# Altium footprint library lib_datalogger.PcbLib: 866 footprints (part 17 of 55)
Each footprint in its own frame and in the unit in brackets; x right, y up, seen from the top. Pads: shape width x height; smd on the part's side, far side on the other; paste and mask are expansions set on the pad; w line width, h text height; cw(c..) or ccw(c..) is an arc to the next point about the centre after c.
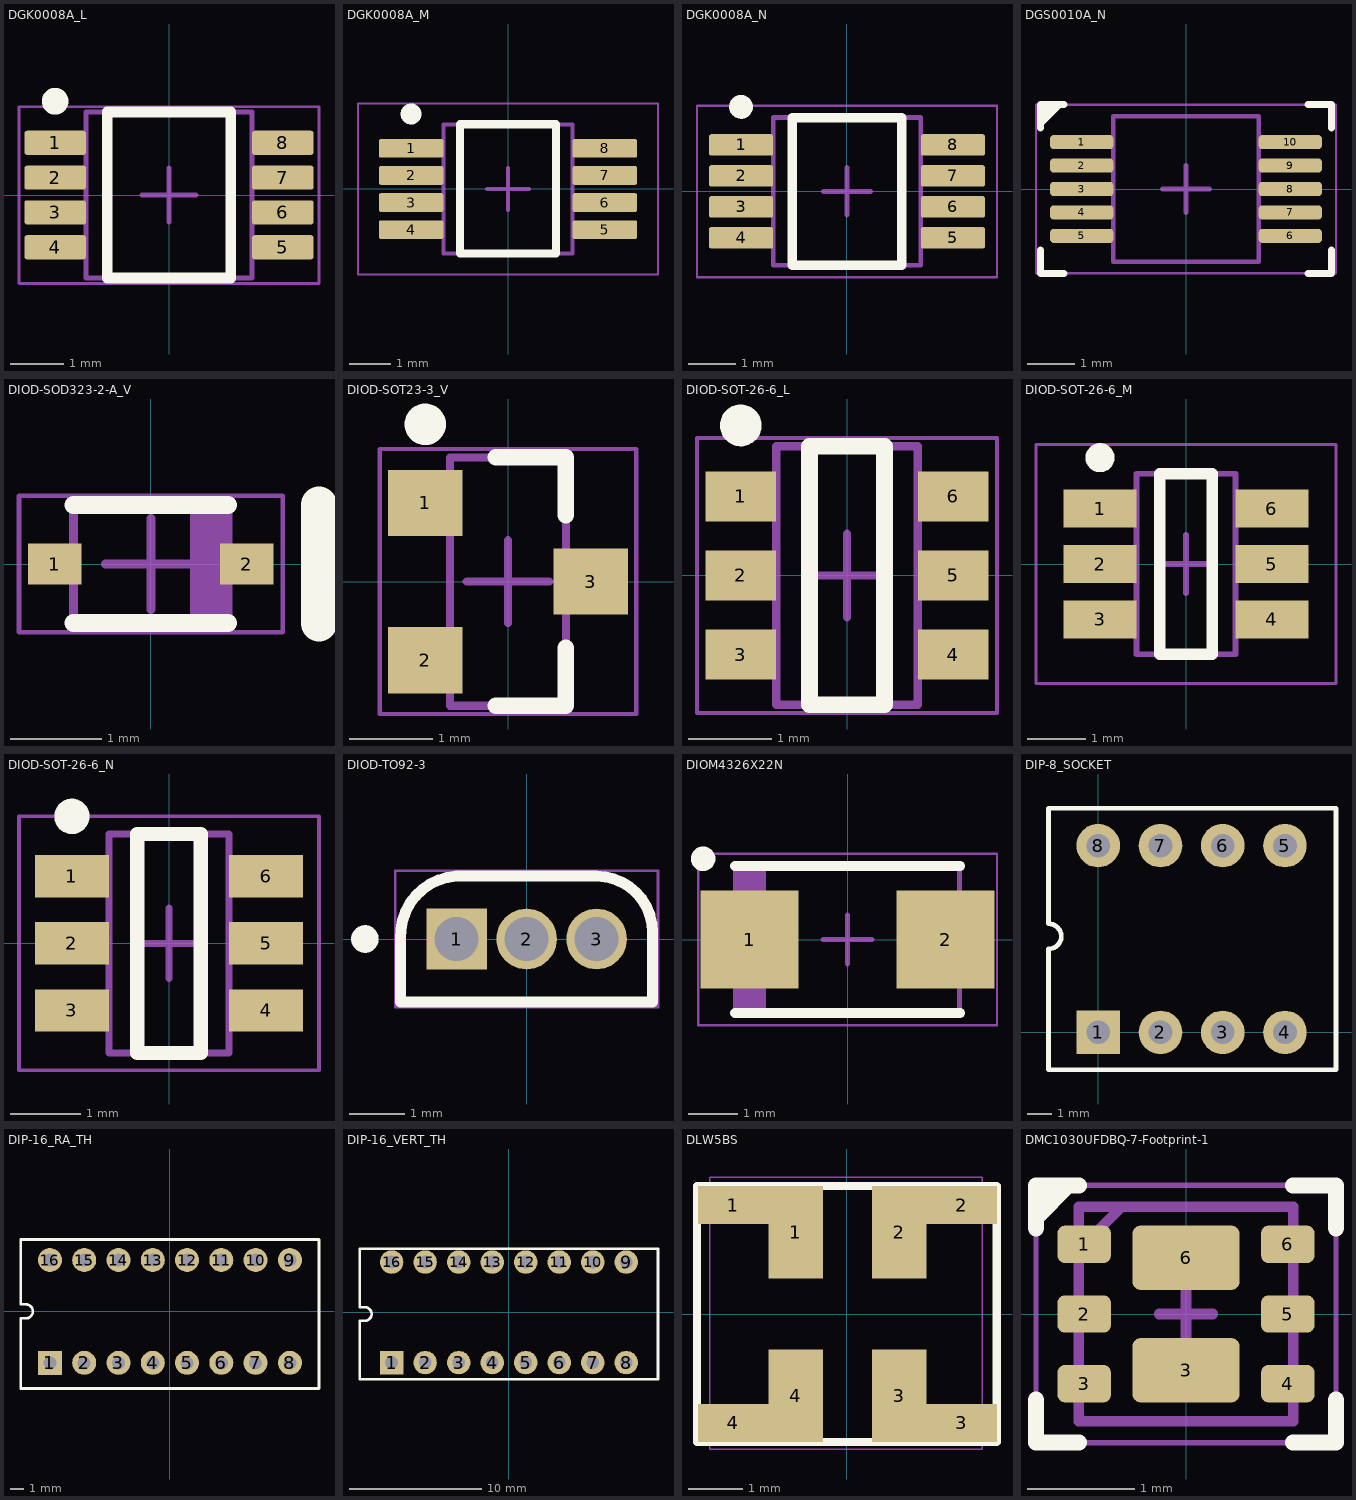
[diagram p16: the footprints below, top view; thin cyan lines are the x and y axes]

## DGK0008A_L [mm] "TSOP, 8-Leads, Body 3.1x3.1mm, Pitch 0.65mm, IPC High Density"
height 1.1
pads (8):
  rrect22% 1.15x0.45 smd: 1(-2.125,0.975) 2(-2.125,0.325) 3(-2.125,-0.325) 4(-2.125,-0.975) 5(2.125,-0.975) 6(2.125,-0.325) 7(2.125,0.325) 8(2.125,0.975)
Top Overlay:
  circle w0.25: c-2.125,1.75 r0.125
  lines w0.2: -1.15,-1.55 1.15,-1.55 1.15,1.55 -1.15,1.55 -1.15,-1.55
Mechanical 1:
  text ".Designator" at -1.397,-0.254 h0.7
Mechanical 13:
  lines w0.1: -1.55,-1.55 1.55,-1.55 1.55,1.55 -1.55,1.55 -1.55,-1.55
Mechanical 15:
  lines w0.05: -2.8,-1.65 2.8,-1.65 2.8,1.65 -2.8,1.65 -2.8,-1.65
  lines w0.1: -0.5,0 0.5,0 ; 0,-0.5 0,0.5
3D body "MUY08A_ASM.stp": height 0.94, standoff -0.02, extent -2.451,-1.499 2.451,1.499

## DGK0008A_M [mm] "TSOP, 8-Leads, Body 3.1x3.1mm, Pitch 0.65mm, IPC Low Density"
height 1.1
pads (8):
  rrect22% 1.55x0.45 smd: 1(-2.325,0.975) 2(-2.325,0.325) 3(-2.325,-0.325) 4(-2.325,-0.975) 5(2.325,-0.975) 6(2.325,-0.325) 7(2.325,0.325) 8(2.325,0.975)
Top Overlay:
  circle w0.25: c-2.325,1.8 r0.125
  lines w0.2: -1.15,-1.55 -1.15,1.55 1.15,1.55 1.15,-1.55 -1.15,-1.55
Mechanical 1:
  text ".Designator" at -1.397,-0.254 h0.7
Mechanical 13:
  lines w0.1: -1.55,-1.55 -1.55,1.55 1.55,1.55 1.55,-1.55 -1.55,-1.55
Mechanical 15:
  lines w0.05: -3.6,-2.05 -3.6,2.05 3.6,2.05 3.6,-2.05 -3.6,-2.05
  lines w0.1: -0.5,0 0.5,0 ; 0,-0.5 0,0.5
3D body "MUY08A_ASM.stp": height 0.94, standoff -0.02, extent -2.451,-1.499 2.451,1.499

## DGK0008A_N [mm] "TSOP, 8-Leads, Body 3.1x3.1mm, Pitch 0.65mm, IPC Medium Density"
height 1.1
pads (8):
  rrect22% 1.35x0.45 smd: 1(-2.225,0.975) 2(-2.225,0.325) 3(-2.225,-0.325) 4(-2.225,-0.975) 5(2.225,-0.975) 6(2.225,-0.325) 7(2.225,0.325) 8(2.225,0.975)
Top Overlay:
  circle w0.25: c-2.225,1.775 r0.125
  lines w0.2: -1.15,-1.55 -1.15,1.55 1.15,1.55 1.15,-1.55 -1.15,-1.55
Mechanical 1:
  text ".Designator" at -1.397,-0.254 h0.7
Mechanical 13:
  lines w0.1: -1.55,-1.55 -1.55,1.55 1.55,1.55 1.55,-1.55 -1.55,-1.55
Mechanical 15:
  lines w0.05: -3.15,-1.8 -3.15,1.8 3.15,1.8 3.15,-1.8 -3.15,-1.8
  lines w0.1: -0.5,0 0.5,0 ; 0,-0.5 0,0.5
3D body "MUY08A_ASM.stp": height 0.94, standoff -0.02, extent -2.451,-1.499 2.451,1.499

## DGS0010A_N [mm] "SOP, 10-Leads, Body 3.1x3.1mm, Pitch 0.5mm, IPC Medium Density"
height 1.1
pads (10):
  rrect50% 1.35x0.3 smd: 1(-2.225,1) 2(-2.225,0.5) 3(-2.225,0) 4(-2.225,-0.5) 5(-2.225,-1) 6(2.225,-1) 7(2.225,-0.5) 8(2.225,0) 9(2.225,0.5) 10(2.225,1)
Top Overlay:
  region: -3.1,1.8 -3.1,1.4 -2.7,1.8
  lines w0.15: -3.1,-1.3 -3.1,-1.8 -2.6,-1.8 ; -3.1,1.3 -3.1,1.8 -2.6,1.8 ; -2.7,1.8 -3.1,1.4 ; 2.6,-1.8 3.1,-1.8 3.1,-1.3 ; 2.6,1.8 3.1,1.8 3.1,1.3 ; -3.1,1.4 -3.1,1.4
Mechanical 13:
  lines w0.1: -1.55,-1.55 1.55,-1.55 1.55,1.55 -1.55,1.55 -1.55,-1.55
Mechanical 15:
  lines w0.05: -3.2,-1.8 3.2,-1.8 3.2,1.8 -3.2,1.8 -3.2,-1.8
  lines w0.1: -0.5,0 0.5,0 ; 0,-0.5 0,0.5
Top Designator:
  text ".Designator" at -1.397,-0.254 h0.6
3D body "DGS0010AakaMUB10A.stp": height 0.94, standoff -0.02, extent -2.451,-1.498 2.451,1.499

## DIOD-SOD323-2-A_V [mm] "SOD-323, 2-Leads, Body 1.7x1.3mm, Lead Span 2.5mm"
height 1.2
pads (2):
  rect 0.59x0.45 smd: 1(-1.055,0) 2(1.055,0)
Top Overlay:
  lines w0.2: -0.85,-0.65 0.85,-0.65 ; -0.85,0.65 0.85,0.65
  lines w0.4: 1.85,-0.65 1.85,0.65
Mechanical 13:
  region: 0.85,0.65 0.432,0.65 0.432,-0.65 0.85,-0.65
  lines w0.1: -0.85,-0.65 0.85,-0.65 0.85,0.65 -0.85,0.65 -0.85,-0.65
Mechanical 15:
  lines w0.05: -1.45,-0.75 1.45,-0.75 1.45,0.75 -1.45,0.75 -1.45,-0.75
  lines w0.1: -0.5,0 0.5,0 ; 0,-0.5 0,0.5
3D body "TSSOP0P250X120-2L.step": height 1.2, standoff 0.01, extent -1.243,-0.7 1.243,0.7

## DIOD-SOT23-3_V [mm] "SOT23, 3-Leads, Body 3x1.4mm, Pitch 0.95mm"
height 1.1
pads (3):
  rect 0.9x0.8 smd: 1(-1,0.95) 2(-1,-0.95) 3(1,0)
Top Overlay:
  circle w0.25: c-1,1.9 r0.125
  lines w0.2: -0.15,-1.5 0.7,-1.5 0.7,-0.8 ; -0.15,1.5 0.7,1.5 0.7,0.8
Mechanical 13:
  lines w0.1: -0.7,-1.5 -0.7,1.5 0.7,1.5 0.7,-1.5 -0.7,-1.5
Mechanical 15:
  lines w0.05: -1.55,-1.6 -1.55,1.6 1.55,1.6 1.55,-1.6 -1.55,-1.6
  lines w0.1: -0.5,0 0.5,0 ; 0,-0.5 0,0.5
3D body "SOT95P240X110-3L.step": height 1.1, standoff 0, extent -1.25,-1.5 1.25,1.5

## DIOD-SOT-26-6_L [mm] "SOT23, 6-Leads, Body 3.1x1.7mm, Pitch 0.95mm, IPC High Density"
height 1.37
pads (6):
  rect 0.85x0.6 smd: 1(-1.275,0.95) 2(-1.275,0) 3(-1.275,-0.95) 4(1.275,-0.95) 5(1.275,0) 6(1.275,0.95)
Top Overlay:
  circle w0.25: c-1.275,1.8 r0.125
  lines w0.2: -0.45,-1.55 -0.45,1.55 0.45,1.55 0.45,-1.55 -0.45,-1.55
Mechanical 13:
  lines w0.1: -0.85,-1.55 0.85,-1.55 0.85,1.55 -0.85,1.55 -0.85,-1.55
Mechanical 15:
  lines w0.05: -1.8,-1.65 1.8,-1.65 1.8,1.65 -1.8,1.65 -1.8,-1.65
  lines w0.1: -0.5,0 0.5,0 ; 0,-0.5 0,0.5
3D body "SOT95P285X136-6L.step": height 1.36, standoff 0, extent -1.5,-1.55 1.5,1.55

## DIOD-SOT-26-6_M [mm] "SOT23, 6-Leads, Body 3.1x1.7mm, Pitch 0.95mm, IPC Low Density"
height 1.37
pads (6):
  rect 1.25x0.65 smd: 1(-1.475,0.95) 2(-1.475,0) 3(-1.475,-0.95) 4(1.475,-0.95) 5(1.475,0) 6(1.475,0.95)
Top Overlay:
  circle w0.25: c-1.475,1.825 r0.125
  lines w0.2: -0.45,-1.55 -0.45,1.55 0.45,1.55 0.45,-1.55 -0.45,-1.55
Mechanical 13:
  lines w0.1: -0.85,-1.55 0.85,-1.55 0.85,1.55 -0.85,1.55 -0.85,-1.55
Mechanical 15:
  lines w0.05: -2.575,-2.05 2.575,-2.05 2.575,2.05 -2.575,2.05 -2.575,-2.05
  lines w0.1: -0.5,0 0.5,0 ; 0,-0.5 0,0.5
3D body "SOT95P285X136-6M.step": height 1.36, standoff 0, extent -1.5,-1.55 1.5,1.55

## DIOD-SOT-26-6_N [mm] "SOT23, 6-Leads, Body 3.1x1.7mm, Pitch 0.95mm, IPC Medium Density"
height 1.37
pads (6):
  rect 1.05x0.6 smd: 1(-1.375,0.95) 2(-1.375,0) 3(-1.375,-0.95) 4(1.375,-0.95) 5(1.375,0) 6(1.375,0.95)
Top Overlay:
  circle w0.25: c-1.375,1.8 r0.125
  lines w0.2: -0.45,-1.55 -0.45,1.55 0.45,1.55 0.45,-1.55 -0.45,-1.55
Mechanical 13:
  lines w0.1: -0.85,-1.55 0.85,-1.55 0.85,1.55 -0.85,1.55 -0.85,-1.55
Mechanical 15:
  lines w0.05: -2.125,-1.8 2.125,-1.8 2.125,1.8 -2.125,1.8 -2.125,-1.8
  lines w0.1: -0.5,0 0.5,0 ; 0,-0.5 0,0.5
3D body "SOT95P285X136-6N.step": height 1.36, standoff 0, extent -1.5,-1.55 1.5,1.55

## DIOD-TO92-3 [mm] "TO, 3-Leads, Body Dia 4.57mm, Pitch 1.27mm"
height 6.51
pads (3):
  rect 1.1x1.1 hole 0.8 mask+0.05: 1(-1.27,0)
  round 1.1 hole 0.8 mask+0.05: 2(0,0) 3(1.27,0)
Top Overlay:
  circle w0.25: c-2.935,0 r0.125
  lines w0.2: -2.285,-1.14 -2.285,0.008 cw(c-1.212,0.067) -1.27,1.14 1.27,1.14 cw(c1.27,0.125) 2.285,0.125 2.285,-1.14 -2.285,-1.14
Mechanical 13:
  lines w0.1: -2.285,-1.14 -2.285,0.005 cw(c-1.21,0.065) -1.27,1.14 1.27,1.14 cw(c1.222,0.078) 2.285,0.03 2.285,-1.14 -2.285,-1.14
Mechanical 15:
  lines w0.05: -2.385,-1.24 -2.385,1.24 2.385,1.24 2.385,-1.24 -2.385,-1.24
  lines w0.1: -0.5,0 0.5,0 ; 0,-0.5 0,0.5
3D body: height 4.01, standoff 2.5, extent -2.285,-1.14 2.285,1.14
3D body: height 2.5, standoff -13.5, extent -1.494,-0.224 -1.046,0.224
3D body: height 2.5, standoff -13.5, extent -0.224,-0.224 0.225,0.225
3D body: height 2.5, standoff -13.5, extent 1.046,-0.224 1.495,0.225

## DIOM4326X22N [mm] "Molded Diode, 2-Leads, Body 4,31x2,61mm, IPC Medium Density"
height 2.2
pads (2):
  rect 2x2 smd: 1(-2,0) 2(2,0)
Top Overlay:
  circle w0.25: c-2.95,1.65 r0.125
  lines w0.2: -2.3,-1.5 2.3,-1.5 ; -2.3,1.5 2.3,1.5
Mechanical 13:
  rectangle: -2.285,-1.46 -1.67,1.46
  lines w0.1: -2.285,-1.46 2.285,-1.46 2.285,1.46 -2.285,1.46 -2.285,-1.46
Mechanical 15:
  lines w0.05: -3.05,-1.75 3.05,-1.75 3.05,1.75 -3.05,1.75 -3.05,-1.75
  lines w0.1: -0.5,0 0.5,0 ; 0,-0.5 0,0.5
3D body "DIOM4326X22N.step": height 2.2, standoff 0, extent -2.505,-1.46 2.505,1.46

## DIP-8_SOCKET [mil] "DIP; 8 Leads; Row Spacing 7.62 mm; Pitch 2.54 mm"
height 200
pads (8):
  rect 70x70 hole 38: 1(0,0)
  round 70 hole 38: 2(100,0) 3(200,0) 4(300,0) 5(300,300) 6(200,300) 7(100,300) 8(0,300)
Top Overlay:
  lines w7.87: -79.69,-60 -79.69,134 ccw(c-79.69,154.3) -79.69,174.6 -79.69,360 382,360 382,-60 -79.69,-60
3D body "DIP8.step": height 322.48, standoff 52.48, extent -75,-5 375,305
3D body "DIP8 Socket.step": height 196.85, standoff -118.11, extent -50,-50 350,350

## DIP-16_RA_TH [mil] "DIP; 16 Leads; Row Spacing 7.62 mm; Pitch 2.54 mm"
height 200
pads (16):
  rect 70x70 hole 38: 1(-350,-150)
  round 70 hole 38: 2(-250,-150) 3(-150,-150) 4(-50,-150) 5(50,-150) 6(150,-150) 7(250,-150) 8(350,-150) 9(350,150) 10(250,150) 11(150,150) 12(50,150) 13(-50,150) 14(-150,150) 15(-250,150) 16(-350,150)
Top Overlay:
  lines w7.87: -420,20.6 cw(c-420,0.3) -420,-20 -435,-20 -435,-225 435,-225 435,210 -435,210 -435,21 -420,21
3D body "KAP1108E.stp": height 396.03, standoff -135.47, extent -430.71,-291.46 430.71,205

## DIP-16_VERT_TH [mil] "DIP; 16 Leads; Row Spacing 7.62 mm; Pitch 2.54 mm"
height 200
pads (16):
  rect 70x70 hole 38: 1(-350,-150)
  round 70 hole 38: 2(-250,-150) 3(-150,-150) 4(-50,-150) 5(50,-150) 6(150,-150) 7(250,-150) 8(350,-150) 9(350,150) 10(250,150) 11(150,150) 12(50,150) 13(-50,150) 14(-150,150) 15(-250,150) 16(-350,150)
Top Overlay:
  lines w7.87: -445,-200 445,-200 445,190 -445,190 -445,15.3 -430,15.3 cw(c-430,-5) -430,-25.3 -445,-25.3 -445,-200
3D body "DIP SWITCH 8 POS CTS 206.step": height 324.8, standoff -137.8, extent -442.91,-197.52 442.91,187.52

## DLW5BS [mm] "DLW5BS Series"
height 4.5
pads (8):
  rect 1.3x0.7 smd: 1(-2.083,1.999) 2(2.108,1.999) 3(2.108,-1.999) 4(-2.083,-1.999)
  rect 1x1.7 smd: 1(-0.94,1.499) 2(0.965,1.499) 3(0.965,-1.499) 4(-0.94,-1.499)
Top Overlay:
  lines w0.152: -2.751,-2.35 2.751,-2.35 2.751,2.35 -2.751,2.35 -2.751,-2.35
Mechanical 1:
  lines w0.025: -2.515,-2.487 2.485,-2.487 2.485,2.513 -2.515,2.513 -2.515,-2.487
3D body "User Library-DLW5BT.STEP": height 2.45, standoff 0, extent -2.515,-2.488 2.485,2.512

## DMC1030UFDBQ-7-Footprint-1 [mm]
pads (8):
  rrect40% 0.5x0.35 smd: 1(-0.95,0.65) 2(-0.95,0) 3(-0.95,-0.65) 4(0.95,-0.65) 5(0.95,0) 6(0.95,0.65)
  rrect25% 1x0.6 smd: 3(0,-0.525) 6(0,0.525)
Top Overlay:
  region: -1.4,1.2 -1.4,0.9 -1.1,1.2
  lines w0.15: -1.4,-0.8 -1.4,-1.2 -1,-1.2 ; -1.4,0.8 -1.4,1.2 -1,1.2 ; -1.4,0.9 -1.1,1.2 ; 1,-1.2 1.4,-1.2 1.4,-0.8 ; 1,1.2 1.4,1.2 1.4,0.8
Mechanical 13:
  lines w0.1: -1,0.6 -0.6,1 ; -1,-1 -1,1 1,1 1,-1 -1,-1
Mechanical 15:
  lines w0.05: -1.4,-1.2 -1.4,1.2 1.4,1.2 1.4,-1.2 -1.4,-1.2
  lines w0.1: -0.25,0 0.25,0 ; 0,-0.25 0,0.25
Top Designator:
  text ".Designator" at -0.254,-0.127 h0.6
3D body "SOT1118 DFN2020-6.STEP": height 0.65, standoff 0, extent -1.04,-1.004 1.04,1.004